# Altium footprint library Connector-Header.PcbLib: 166 footprints (part 7 of 11)
Each footprint in its own frame and in the unit in brackets; x right, y up, seen from the top. Pads: shape width x height; smd on the part's side, far side on the other; paste and mask are expansions set on the pad; w line width, h text height; cw(c..) or ccw(c..) is an arc to the next point about the centre after c.
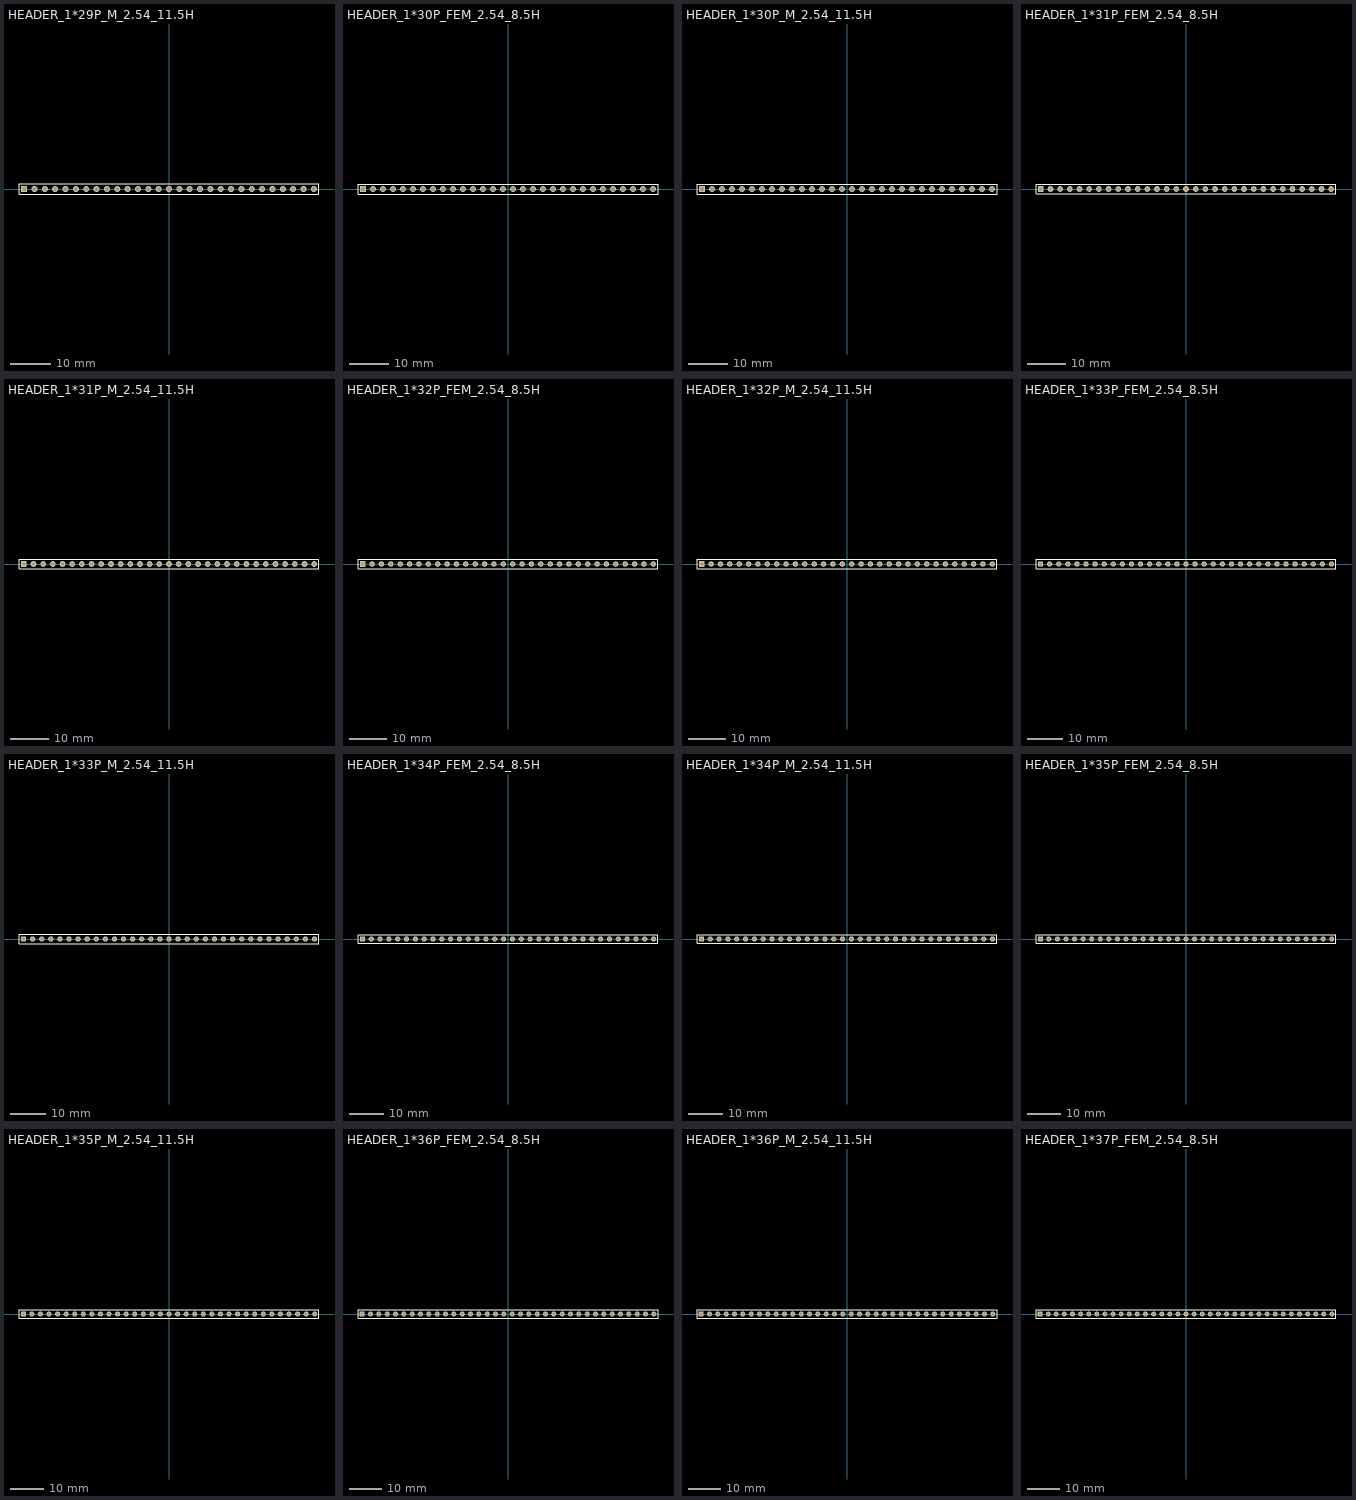
[diagram p6: the footprints below, top view; thin cyan lines are the x and y axes]

## HEADER_1*29P_M_2.54_11.5H [mm] "Connector; Header; 29 Position"
pads (29):
  rect 1.5x1.5 hole 0.9: 1(-35.56,0)
  round 1.5 hole 0.9: 2(-33.02,0) 3(-30.48,0) 4(-27.94,0) 5(-25.4,0) 6(-22.86,0) 7(-20.32,0) 8(-17.78,0) 9(-15.24,0) 10(-12.7,0) 11(-10.16,0) 12(-7.62,0) 13(-5.08,0) 14(-2.54,0) 15(0,0) 16(2.54,0) 17(5.08,0) 18(7.62,0) 19(10.16,0) 20(12.7,0) 21(15.24,0) 22(17.78,0) 23(20.32,0) 24(22.86,0) 25(25.4,0) 26(27.94,0) 27(30.48,0) 28(33.02,0) 29(35.56,0)
Top Overlay:
  lines w0.2: -36.83,-1.27 -36.83,1.27 -34.925,1.27 36.83,1.27 36.83,-1.27 -36.83,-1.27
3D body "PinHeader_1x29_P2.54mm_Vertical.step": height 8.54, standoff -3, extent -36.83,-1.27 36.83,1.27

## HEADER_1*30P_FEM_2.54_8.5H [mm] "Connector; Header; 30 Position"
pads (30):
  rect 1.5x1.5 hole 0.9: 1(-36.83,0)
  round 1.5 hole 0.9: 2(-34.29,0) 3(-31.75,0) 4(-29.21,0) 5(-26.67,0) 6(-24.13,0) 7(-21.59,0) 8(-19.05,0) 9(-16.51,0) 10(-13.97,0) 11(-11.43,0) 12(-8.89,0) 13(-6.35,0) 14(-3.81,0) 15(-1.27,0) 16(1.27,0) 17(3.81,0) 18(6.35,0) 19(8.89,0) 20(11.43,0) 21(13.97,0) 22(16.51,0) 23(19.05,0) 24(21.59,0) 25(24.13,0) 26(26.67,0) 27(29.21,0) 28(31.75,0) 29(34.29,0) 30(36.83,0)
Top Overlay:
  lines w0.2: 38.075,1.27 -36.195,1.27 -38.1,1.27 -38.1,-1.27 38.1,-1.27 38.1,1.27
3D body "PinSocket_1x30_P2.54mm_Vertical.step": height 7, standoff -3.1, extent -38.1,-1.27 38.1,1.27

## HEADER_1*30P_M_2.54_11.5H [mm] "Connector; Header; 30 Position"
pads (30):
  rect 1.5x1.5 hole 0.9: 1(-36.83,0)
  round 1.5 hole 0.9: 2(-34.29,0) 3(-31.75,0) 4(-29.21,0) 5(-26.67,0) 6(-24.13,0) 7(-21.59,0) 8(-19.05,0) 9(-16.51,0) 10(-13.97,0) 11(-11.43,0) 12(-8.89,0) 13(-6.35,0) 14(-3.81,0) 15(-1.27,0) 16(1.27,0) 17(3.81,0) 18(6.35,0) 19(8.89,0) 20(11.43,0) 21(13.97,0) 22(16.51,0) 23(19.05,0) 24(21.59,0) 25(24.13,0) 26(26.67,0) 27(29.21,0) 28(31.75,0) 29(34.29,0) 30(36.83,0)
Top Overlay:
  lines w0.2: 38.075,1.27 -36.195,1.27 -38.1,1.27 -38.1,-1.27 38.1,-1.27 38.1,1.27
3D body "PinHeader_1x30_P2.54mm_Vertical.step": height 8.54, standoff -3, extent -38.1,-1.27 38.1,1.27

## HEADER_1*31P_FEM_2.54_8.5H [mm] "Connector; Header; 31 Position"
pads (31):
  rect 1.5x1.5 hole 0.9: 1(-38.1,0)
  round 1.5 hole 0.9: 2(-35.56,0) 3(-33.02,0) 4(-30.48,0) 5(-27.94,0) 6(-25.4,0) 7(-22.86,0) 8(-20.32,0) 9(-17.78,0) 10(-15.24,0) 11(-12.7,0) 12(-10.16,0) 13(-7.62,0) 14(-5.08,0) 15(-2.54,0) 16(0,0) 17(2.54,0) 18(5.08,0) 19(7.62,0) 20(10.16,0) 21(12.7,0) 22(15.24,0) 23(17.78,0) 24(20.32,0) 25(22.86,0) 26(25.4,0) 27(27.94,0) 28(30.48,0) 29(33.02,0) 30(35.56,0) 31(38.1,0)
Top Overlay:
  lines w0.2: -39.37,-1.27 -39.37,1.27 -37.465,1.27 39.37,1.27 39.37,-1.27 -39.37,-1.27
3D body "PinSocket_1x31_P2.54mm_Vertical.step": height 7, standoff -3.1, extent -39.37,-1.27 39.37,1.27

## HEADER_1*31P_M_2.54_11.5H [mm] "Connector; Header; 31 Position"
pads (31):
  rect 1.5x1.5 hole 0.9: 1(-38.1,0)
  round 1.5 hole 0.9: 2(-35.56,0) 3(-33.02,0) 4(-30.48,0) 5(-27.94,0) 6(-25.4,0) 7(-22.86,0) 8(-20.32,0) 9(-17.78,0) 10(-15.24,0) 11(-12.7,0) 12(-10.16,0) 13(-7.62,0) 14(-5.08,0) 15(-2.54,0) 16(0,0) 17(2.54,0) 18(5.08,0) 19(7.62,0) 20(10.16,0) 21(12.7,0) 22(15.24,0) 23(17.78,0) 24(20.32,0) 25(22.86,0) 26(25.4,0) 27(27.94,0) 28(30.48,0) 29(33.02,0) 30(35.56,0) 31(38.1,0)
Top Overlay:
  lines w0.2: -39.37,-1.27 39.37,-1.27 39.37,1.27 -37.465,1.27 -39.37,1.27 -39.37,-1.27
3D body "PinHeader_1x31_P2.54mm_Vertical.step": height 8.54, standoff -3, extent -39.37,-1.27 39.37,1.27

## HEADER_1*32P_FEM_2.54_8.5H [mm] "Connector; Header; 32 Position"
pads (32):
  rect 1.5x1.5 hole 0.9: 1(-39.37,0)
  round 1.5 hole 0.9: 2(-36.83,0) 3(-34.29,0) 4(-31.75,0) 5(-29.21,0) 6(-26.67,0) 7(-24.13,0) 8(-21.59,0) 9(-19.05,0) 10(-16.51,0) 11(-13.97,0) 12(-11.43,0) 13(-8.89,0) 14(-6.35,0) 15(-3.81,0) 16(-1.27,0) 17(1.27,0) 18(3.81,0) 19(6.35,0) 20(8.89,0) 21(11.43,0) 22(13.97,0) 23(16.51,0) 24(19.05,0) 25(21.59,0) 26(24.13,0) 27(26.67,0) 28(29.21,0) 29(31.75,0) 30(34.29,0) 31(36.83,0) 32(39.37,0)
Top Overlay:
  lines w0.2: -40.64,-1.27 40.64,-1.27 40.64,1.27 -38.735,1.27 -40.64,1.27 -40.64,-1.27
3D body "PinSocket_1x32_P2.54mm_Vertical.step": height 7, standoff -3.1, extent -40.64,-1.27 40.64,1.27

## HEADER_1*32P_M_2.54_11.5H [mm] "Connector; Header; 32 Position"
pads (32):
  rect 1.5x1.5 hole 0.9: 1(-39.37,0)
  round 1.5 hole 0.9: 2(-36.83,0) 3(-34.29,0) 4(-31.75,0) 5(-29.21,0) 6(-26.67,0) 7(-24.13,0) 8(-21.59,0) 9(-19.05,0) 10(-16.51,0) 11(-13.97,0) 12(-11.43,0) 13(-8.89,0) 14(-6.35,0) 15(-3.81,0) 16(-1.27,0) 17(1.27,0) 18(3.81,0) 19(6.35,0) 20(8.89,0) 21(11.43,0) 22(13.97,0) 23(16.51,0) 24(19.05,0) 25(21.59,0) 26(24.13,0) 27(26.67,0) 28(29.21,0) 29(31.75,0) 30(34.29,0) 31(36.83,0) 32(39.37,0)
Top Overlay:
  lines w0.2: -40.64,-1.27 -40.64,1.27 -38.735,1.27 40.64,1.27 40.64,-1.27 -40.64,-1.27
3D body "PinHeader_1x32_P2.54mm_Vertical.step": height 8.54, standoff -3, extent -40.64,-1.27 40.64,1.27

## HEADER_1*33P_FEM_2.54_8.5H [mm] "Connector; Header; 33 Position"
pads (33):
  rect 1.5x1.5 hole 0.9: 1(-40.64,0)
  round 1.5 hole 0.9: 2(-38.1,0) 3(-35.56,0) 4(-33.02,0) 5(-30.48,0) 6(-27.94,0) 7(-25.4,0) 8(-22.86,0) 9(-20.32,0) 10(-17.78,0) 11(-15.24,0) 12(-12.7,0) 13(-10.16,0) 14(-7.62,0) 15(-5.08,0) 16(-2.54,0) 17(0,0) 18(2.54,0) 19(5.08,0) 20(7.62,0) 21(10.16,0) 22(12.7,0) 23(15.24,0) 24(17.78,0) 25(20.32,0) 26(22.86,0) 27(25.4,0) 28(27.94,0) 29(30.48,0) 30(33.02,0) 31(35.56,0) 32(38.1,0) 33(40.64,0)
Top Overlay:
  lines w0.2: -41.91,-1.27 -41.91,1.27 -40.005,1.27 41.91,1.27 41.91,-1.27 -41.91,-1.27
3D body "PinSocket_1x33_P2.54mm_Vertical.step": height 7, standoff -3.1, extent -41.91,-1.27 41.91,1.27

## HEADER_1*33P_M_2.54_11.5H [mm] "Connector; Header; 33 Position"
pads (33):
  rect 1.5x1.5 hole 0.9: 1(-40.64,0)
  round 1.5 hole 0.9: 2(-38.1,0) 3(-35.56,0) 4(-33.02,0) 5(-30.48,0) 6(-27.94,0) 7(-25.4,0) 8(-22.86,0) 9(-20.32,0) 10(-17.78,0) 11(-15.24,0) 12(-12.7,0) 13(-10.16,0) 14(-7.62,0) 15(-5.08,0) 16(-2.54,0) 17(0,0) 18(2.54,0) 19(5.08,0) 20(7.62,0) 21(10.16,0) 22(12.7,0) 23(15.24,0) 24(17.78,0) 25(20.32,0) 26(22.86,0) 27(25.4,0) 28(27.94,0) 29(30.48,0) 30(33.02,0) 31(35.56,0) 32(38.1,0) 33(40.64,0)
Top Overlay:
  lines w0.2: -41.91,-1.27 41.91,-1.27 41.91,1.27 -40.005,1.27 -41.91,1.27 -41.91,-1.27
3D body "PinHeader_1x33_P2.54mm_Vertical.step": height 8.54, standoff -3, extent -41.91,-1.27 41.91,1.27

## HEADER_1*34P_FEM_2.54_8.5H [mm] "Connector; Header; 34 Position"
pads (34):
  rect 1.5x1.5 hole 0.9: 1(-41.91,0)
  round 1.5 hole 0.9: 2(-39.37,0) 3(-36.83,0) 4(-34.29,0) 5(-31.75,0) 6(-29.21,0) 7(-26.67,0) 8(-24.13,0) 9(-21.59,0) 10(-19.05,0) 11(-16.51,0) 12(-13.97,0) 13(-11.43,0) 14(-8.89,0) 15(-6.35,0) 16(-3.81,0) 17(-1.27,0) 18(1.27,0) 19(3.81,0) 20(6.35,0) 21(8.89,0) 22(11.43,0) 23(13.97,0) 24(16.51,0) 25(19.05,0) 26(21.59,0) 27(24.13,0) 28(26.67,0) 29(29.21,0) 30(31.75,0) 31(34.29,0) 32(36.83,0) 33(39.37,0) 34(41.91,0)
Top Overlay:
  lines w0.2: -43.18,-1.27 -43.18,1.27 -41.275,1.27 43.18,1.27 43.18,-1.27 -43.18,-1.27
3D body "PinSocket_1x34_P2.54mm_Vertical.step": height 7, standoff -3.1, extent -43.18,-1.27 43.18,1.27

## HEADER_1*34P_M_2.54_11.5H [mm] "Connector; Header; 34 Position"
pads (34):
  rect 1.5x1.5 hole 0.9: 1(-41.91,0)
  round 1.5 hole 0.9: 2(-39.37,0) 3(-36.83,0) 4(-34.29,0) 5(-31.75,0) 6(-29.21,0) 7(-26.67,0) 8(-24.13,0) 9(-21.59,0) 10(-19.05,0) 11(-16.51,0) 12(-13.97,0) 13(-11.43,0) 14(-8.89,0) 15(-6.35,0) 16(-3.81,0) 17(-1.27,0) 18(1.27,0) 19(3.81,0) 20(6.35,0) 21(8.89,0) 22(11.43,0) 23(13.97,0) 24(16.51,0) 25(19.05,0) 26(21.59,0) 27(24.13,0) 28(26.67,0) 29(29.21,0) 30(31.75,0) 31(34.29,0) 32(36.83,0) 33(39.37,0) 34(41.91,0)
Top Overlay:
  lines w0.2: -43.18,-1.27 43.18,-1.27 43.18,1.27 -41.275,1.27 -43.18,1.27 -43.18,-1.27
3D body "PinHeader_1x34_P2.54mm_Vertical.step": height 8.54, standoff -3, extent -43.18,-1.27 43.18,1.27

## HEADER_1*35P_FEM_2.54_8.5H [mm] "Connector; Header; 35 Position"
pads (35):
  rect 1.5x1.5 hole 0.9: 1(-43.18,0)
  round 1.5 hole 0.9: 2(-40.64,0) 3(-38.1,0) 4(-35.56,0) 5(-33.02,0) 6(-30.48,0) 7(-27.94,0) 8(-25.4,0) 9(-22.86,0) 10(-20.32,0) 11(-17.78,0) 12(-15.24,0) 13(-12.7,0) 14(-10.16,0) 15(-7.62,0) 16(-5.08,0) 17(-2.54,0) 18(0,0) 19(2.54,0) 20(5.08,0) 21(7.62,0) 22(10.16,0) 23(12.7,0) 24(15.24,0) 25(17.78,0) 26(20.32,0) 27(22.86,0) 28(25.4,0) 29(27.94,0) 30(30.48,0) 31(33.02,0) 32(35.56,0) 33(38.1,0) 34(40.64,0) 35(43.18,0)
Top Overlay:
  lines w0.2: -44.45,-1.27 -44.45,1.27 -42.545,1.27 44.45,1.27 44.45,-1.27 -44.45,-1.27
3D body "PinSocket_1x35_P2.54mm_Vertical.step": height 7, standoff -3.1, extent -44.45,-1.27 44.45,1.27

## HEADER_1*35P_M_2.54_11.5H [mm] "Connector; Header; 35 Position"
pads (35):
  rect 1.5x1.5 hole 0.9: 1(-43.18,0)
  round 1.5 hole 0.9: 2(-40.64,0) 3(-38.1,0) 4(-35.56,0) 5(-33.02,0) 6(-30.48,0) 7(-27.94,0) 8(-25.4,0) 9(-22.86,0) 10(-20.32,0) 11(-17.78,0) 12(-15.24,0) 13(-12.7,0) 14(-10.16,0) 15(-7.62,0) 16(-5.08,0) 17(-2.54,0) 18(0,0) 19(2.54,0) 20(5.08,0) 21(7.62,0) 22(10.16,0) 23(12.7,0) 24(15.24,0) 25(17.78,0) 26(20.32,0) 27(22.86,0) 28(25.4,0) 29(27.94,0) 30(30.48,0) 31(33.02,0) 32(35.56,0) 33(38.1,0) 34(40.64,0) 35(43.18,0)
Top Overlay:
  lines w0.2: -44.45,-1.27 44.45,-1.27 44.45,1.27 -42.545,1.27 -44.45,1.27 -44.45,-1.27
3D body "PinHeader_1x35_P2.54mm_Vertical.step": height 8.54, standoff -3, extent -44.45,-1.27 44.45,1.27

## HEADER_1*36P_FEM_2.54_8.5H [mm] "Connector; Header; 36 Position"
pads (36):
  rect 1.5x1.5 hole 0.9: 1(-44.45,0)
  round 1.5 hole 0.9: 2(-41.91,0) 3(-39.37,0) 4(-36.83,0) 5(-34.29,0) 6(-31.75,0) 7(-29.21,0) 8(-26.67,0) 9(-24.13,0) 10(-21.59,0) 11(-19.05,0) 12(-16.51,0) 13(-13.97,0) 14(-11.43,0) 15(-8.89,0) 16(-6.35,0) 17(-3.81,0) 18(-1.27,0) 19(1.27,0) 20(3.81,0) 21(6.35,0) 22(8.89,0) 23(11.43,0) 24(13.97,0) 25(16.51,0) 26(19.05,0) 27(21.59,0) 28(24.13,0) 29(26.67,0) 30(29.21,0) 31(31.75,0) 32(34.29,0) 33(36.83,0) 34(39.37,0) 35(41.91,0) 36(44.45,0)
Top Overlay:
  lines w0.2: -45.72,-1.27 45.72,-1.27 45.72,1.27 -43.815,1.27 -45.72,1.27 -45.72,-1.27
3D body "PinSocket_1x36_P2.54mm_Vertical.step": height 7, standoff -3.1, extent -45.72,-1.27 45.72,1.27

## HEADER_1*36P_M_2.54_11.5H [mm] "Connector; Header; 36 Position"
pads (36):
  rect 1.5x1.5 hole 0.9: 1(-44.45,0)
  round 1.5 hole 0.9: 2(-41.91,0) 3(-39.37,0) 4(-36.83,0) 5(-34.29,0) 6(-31.75,0) 7(-29.21,0) 8(-26.67,0) 9(-24.13,0) 10(-21.59,0) 11(-19.05,0) 12(-16.51,0) 13(-13.97,0) 14(-11.43,0) 15(-8.89,0) 16(-6.35,0) 17(-3.81,0) 18(-1.27,0) 19(1.27,0) 20(3.81,0) 21(6.35,0) 22(8.89,0) 23(11.43,0) 24(13.97,0) 25(16.51,0) 26(19.05,0) 27(21.59,0) 28(24.13,0) 29(26.67,0) 30(29.21,0) 31(31.75,0) 32(34.29,0) 33(36.83,0) 34(39.37,0) 35(41.91,0) 36(44.45,0)
Top Overlay:
  lines w0.2: -45.72,-1.27 -45.72,1.27 -43.815,1.27 45.72,1.27 45.72,-1.27 -45.72,-1.27
3D body "PinHeader_1x36_P2.54mm_Vertical.step": height 8.54, standoff -3, extent -45.72,-1.27 45.72,1.27

## HEADER_1*37P_FEM_2.54_8.5H [mm] "Connector; Header; 37 Position"
pads (37):
  rect 1.5x1.5 hole 0.9: 1(-45.72,0)
  round 1.5 hole 0.9: 2(-43.18,0) 3(-40.64,0) 4(-38.1,0) 5(-35.56,0) 6(-33.02,0) 7(-30.48,0) 8(-27.94,0) 9(-25.4,0) 10(-22.86,0) 11(-20.32,0) 12(-17.78,0) 13(-15.24,0) 14(-12.7,0) 15(-10.16,0) 16(-7.62,0) 17(-5.08,0) 18(-2.54,0) 19(0,0) 20(2.54,0) 21(5.08,0) 22(7.62,0) 23(10.16,0) 24(12.7,0) 25(15.24,0) 26(17.78,0) 27(20.32,0) 28(22.86,0) 29(25.4,0) 30(27.94,0) 31(30.48,0) 32(33.02,0) 33(35.56,0) 34(38.1,0) 35(40.64,0) 36(43.18,0) 37(45.72,0)
Top Overlay:
  lines w0.2: -46.99,-1.27 -46.99,1.27 -45.085,1.27 46.99,1.27 46.99,-1.27 -46.99,-1.27
3D body "PinSocket_1x37_P2.54mm_Vertical.step": height 7, standoff -3.1, extent -46.99,-1.27 46.99,1.27